# Altium footprint library Connectors THD.PcbLib: 631 footprints (part 32 of 46) (continued)
## PHOENIX_1881590 [mm] "PHOENIX MCV Serie, Pitch 2.5mm, 4A, 160V, 6 Positions Header" (continued)
3D body: height 10.1, standoff -3.5, extent -8.45,-3.9 8.45,4.2

## PHOENIX_1881613 [mm] "MICRO COMBICON PCB Header, 4 A 80 V, Pitch: 2.5 mm, 8 Positions"
height 10.1
pads (8):
  round 1.9 hole 1.2: 1(-8.75,0) 2(-6.25,0) 3(-3.75,0) 4(-1.25,0) 5(1.25,0) 6(3.75,0) 7(6.25,0) 8(8.75,0)
Top Overlay:
  lines w0.2: -10.95,3.7 10.95,3.7 ; -9.9,-2 9.9,-2 ; -9.9,2 -9.1,2 -9.1,2.5 ccw(c-9.3,2.5) -9.3,2.7 ; -9.1,2.134 -9.9,2.134 -9.9,-2.134 -8.65,-2.134 ; -8.65,-2 -8.65,-3.1 -7.5,-3.1 -7.5,-2 ; -8.4,2.134 -6.6,2.134 ; -8.2,2.7 ccw(c-8.2,2.5) -8.4,2.5 -8.4,2 -6.6,2 -6.6,2.5 ccw(c-6.8,2.5) -6.8,2.7 ; -7.5,-2.134 8.85,-2.134 ; -5.9,2.134 -4.1,2.134 ; -5.7,2.7 ccw(c-5.7,2.5) -5.9,2.5 -5.9,2 -4.1,2 -4.1,2.5 ccw(c-4.3,2.5) -4.3,2.7 ; -3.4,2.134 -1.6,2.134 ; -3.2,2.7 ccw(c-3.2,2.5) -3.4,2.5 -3.4,2 -1.6,2 -1.6,2.5 ccw(c-1.8,2.5) -1.8,2.7 ; -0.9,2.134 0.9,2.134 ; -0.7,2.7 ccw(c-0.7,2.5) -0.9,2.5 -0.9,2 0.9,2 0.9,2.5 ccw(c0.7,2.5) 0.7,2.7 ; 1.6,2.134 3.4,2.134 ; 1.8,2.7 ccw(c1.8,2.5) 1.6,2.5 1.6,2 3.4,2 3.4,2.5 ccw(c3.2,2.5) 3.2,2.7 ; 4.1,2.134 5.9,2.134 ; 4.3,2.7 ccw(c4.3,2.5) 4.1,2.5 4.1,2 5.9,2 5.9,2.5 ccw(c5.7,2.5) 5.7,2.7 ; 6.6,2.134 8.4,2.134 ; 6.8,2.7 ccw(c6.8,2.5) 6.6,2.5 6.6,2 8.4,2 8.4,2.5 ccw(c8.2,2.5) 8.2,2.7 ; 8.85,-2 8.85,-3.1 9.9,-3.1 9.9,2.134 9.1,2.134 ; 9.3,2.7 ccw(c9.3,2.5) 9.1,2.5 9.1,2 9.9,2 ; -10.95,-3.9 10.95,-3.9 10.95,4.2 -10.95,4.2 -10.95,-3.9 ; -9.75,2.7 -7.75,2.7 -7.75,3.35 -9.75,3.35 -9.75,2.7 ; -7.701,-0.75 -7.5,0 -7.299,-0.75 -7.701,-0.75 ; -7.25,2.7 -5.25,2.7 -5.25,3.35 -7.25,3.35 -7.25,2.7 ; -5.201,-0.75 -5,0 -4.799,-0.75 -5.201,-0.75 ; -4.75,2.7 -2.75,2.7 -2.75,3.35 -4.75,3.35 -4.75,2.7 ; -2.701,-0.75 -2.5,0 -2.299,-0.75 -2.701,-0.75 ; -2.25,2.7 -0.25,2.7 -0.25,3.35 -2.25,3.35 -2.25,2.7 ; -0.201,-0.75 0,0 0.201,-0.75 -0.201,-0.75 ; 0.25,2.7 2.25,2.7 2.25,3.35 0.25,3.35 0.25,2.7 ; 2.299,-0.75 2.5,0 2.701,-0.75 2.299,-0.75 ; 2.75,2.7 4.75,2.7 4.75,3.35 2.75,3.35 2.75,2.7 ; 4.799,-0.75 5,0 5.201,-0.75 4.799,-0.75 ; 5.25,2.7 7.25,2.7 7.25,3.35 5.25,3.35 5.25,2.7 ; 7.299,-0.75 7.5,0 7.701,-0.75 7.299,-0.75 ; 7.75,2.7 9.75,2.7 9.75,3.35 7.75,3.35 7.75,2.7
  text "7" at 5.975,4.6 h1
  text "5" at 0.975,4.6 h1
  text "3" at -4.025,4.6 h1
  text "2" at -6.525,4.6 h1
  text "1" at -9.025,4.6 h1
  text "4" at -1.525,4.6 h1
  text "6" at 3.475,4.6 h1
  text "8" at 8.475,4.6 h1
Mechanical 8:
  lines w0.1: -9.75,0 -8.75,0 ; -8.75,-1 -8.75,0 ; -8.75,1 -8.75,0 ; -7.75,0 -8.75,0 ; -7.25,0 -6.25,0 ; -6.25,-1 -6.25,0 ; -6.25,1 -6.25,0 ; -5.25,0 -6.25,0 ; -4.75,0 -3.75,0 ; -3.75,-1 -3.75,0 ; -3.75,1 -3.75,0 ; -2.75,0 -3.75,0 ; -2.25,0 -1.25,0 ; -1.25,-1 -1.25,0 ; -1.25,1 -1.25,0 ; -1,0 0,0 ; -0.25,0 -1.25,0 ; 0,-1 0,0 ; 0,1 0,0 ; 0.25,0 1.25,0 ; 1,0 0,0 ; 1.25,-1 1.25,0 ; 1.25,1 1.25,0 ; 2.25,0 1.25,0 ; 2.75,0 3.75,0 ; 3.75,-1 3.75,0 ; 3.75,1 3.75,0 ; 4.75,0 3.75,0 ; 5.25,0 6.25,0 ; 6.25,-1 6.25,0 ; 6.25,1 6.25,0 ; 7.25,0 6.25,0 ; 7.75,0 8.75,0 ; 8.75,-1 8.75,0 ; 8.75,1 8.75,0 ; 9.75,0 8.75,0
Mechanical 14:
  lines w0.1: -10.95,3.7 10.95,3.7 ; -9.9,-2 9.9,-2 ; -9.9,2 -9.1,2 -9.1,2.5 ccw(c-9.3,2.5) -9.3,2.7 ; -9.1,2.134 -9.9,2.134 -9.9,-2.134 -8.65,-2.134 ; -8.65,-2 -8.65,-3.1 -7.5,-3.1 -7.5,-2 ; -8.4,2.134 -6.6,2.134 ; -8.2,2.7 ccw(c-8.2,2.5) -8.4,2.5 -8.4,2 -6.6,2 -6.6,2.5 ccw(c-6.8,2.5) -6.8,2.7 ; -7.5,-2.134 8.85,-2.134 ; -5.9,2.134 -4.1,2.134 ; -5.7,2.7 ccw(c-5.7,2.5) -5.9,2.5 -5.9,2 -4.1,2 -4.1,2.5 ccw(c-4.3,2.5) -4.3,2.7 ; -3.4,2.134 -1.6,2.134 ; -3.2,2.7 ccw(c-3.2,2.5) -3.4,2.5 -3.4,2 -1.6,2 -1.6,2.5 ccw(c-1.8,2.5) -1.8,2.7 ; -0.9,2.134 0.9,2.134 ; -0.7,2.7 ccw(c-0.7,2.5) -0.9,2.5 -0.9,2 0.9,2 0.9,2.5 ccw(c0.7,2.5) 0.7,2.7 ; 1.6,2.134 3.4,2.134 ; 1.8,2.7 ccw(c1.8,2.5) 1.6,2.5 1.6,2 3.4,2 3.4,2.5 ccw(c3.2,2.5) 3.2,2.7 ; 4.1,2.134 5.9,2.134 ; 4.3,2.7 ccw(c4.3,2.5) 4.1,2.5 4.1,2 5.9,2 5.9,2.5 ccw(c5.7,2.5) 5.7,2.7 ; 6.6,2.134 8.4,2.134 ; 6.8,2.7 ccw(c6.8,2.5) 6.6,2.5 6.6,2 8.4,2 8.4,2.5 ccw(c8.2,2.5) 8.2,2.7 ; 8.85,-2 8.85,-3.1 9.9,-3.1 9.9,2.134 9.1,2.134 ; 9.3,2.7 ccw(c9.3,2.5) 9.1,2.5 9.1,2 9.9,2 ; -10.95,-3.9 10.95,-3.9 10.95,4.2 -10.95,4.2 -10.95,-3.9 ; -9.75,2.7 -7.75,2.7 -7.75,3.35 -9.75,3.35 -9.75,2.7 ; -7.701,-0.75 -7.5,0 -7.299,-0.75 -7.701,-0.75 ; -7.25,2.7 -5.25,2.7 -5.25,3.35 -7.25,3.35 -7.25,2.7 ; -5.201,-0.75 -5,0 -4.799,-0.75 -5.201,-0.75 ; -4.75,2.7 -2.75,2.7 -2.75,3.35 -4.75,3.35 -4.75,2.7 ; -2.701,-0.75 -2.5,0 -2.299,-0.75 -2.701,-0.75 ; -2.25,2.7 -0.25,2.7 -0.25,3.35 -2.25,3.35 -2.25,2.7 ; -0.201,-0.75 0,0 0.201,-0.75 -0.201,-0.75 ; 0.25,2.7 2.25,2.7 2.25,3.35 0.25,3.35 0.25,2.7 ; 2.299,-0.75 2.5,0 2.701,-0.75 2.299,-0.75 ; 2.75,2.7 4.75,2.7 4.75,3.35 2.75,3.35 2.75,2.7 ; 4.799,-0.75 5,0 5.201,-0.75 4.799,-0.75 ; 5.25,2.7 7.25,2.7 7.25,3.35 5.25,3.35 5.25,2.7 ; 7.299,-0.75 7.5,0 7.701,-0.75 7.299,-0.75 ; 7.75,2.7 9.75,2.7 9.75,3.35 7.75,3.35 7.75,2.7
3D body: height 10.1, standoff -3.5, extent -10.95,-3.9 10.95,4.2

## PHOENIX_1881655 [mm] "PCB Header, 4A, 160 V, Pitch: 2.5mm, 12 Positions, MCV Serie"
height 10.1
pads (12):
  round 1.9 hole 1.2: 1(-13.75,0) 2(-11.25,0) 3(-8.75,0) 4(-6.25,0) 5(-3.75,0) 6(-1.25,0) 7(1.25,0) 8(3.75,0) 9(6.25,0) 10(8.75,0) 11(11.25,0) 12(13.75,0)
Top Overlay:
  drawing of 186 lines, arcs and shapes, not listed
  text "1" at -13.61,4.7 h1
  text "12" at 13.06,4.7 h1
  text "11" at 10.56,4.7 h1
  text "10" at 8.06,4.7 h1
  text "9" at 5.91,4.725 h1
  text "8" at 3.41,4.725 h1
  text "7" at 0.91,4.725 h1
  text "6" at -1.59,4.725 h1
  text "5" at -4.09,4.725 h1
  text "4" at -6.59,4.725 h1
  text "3" at -9.09,4.725 h1
  text "2" at -11.59,4.725 h1
Mechanical 8:
  lines w0.1: -14.25,0 -13.75,0 ; -13.75,-0.5 -13.75,0 ; -13.75,0.5 -13.75,0 ; -13.25,0 -13.75,0 ; -11.75,0 -11.25,0 ; -11.25,-0.5 -11.25,0 ; -11.25,0.5 -11.25,0 ; -10.75,0 -11.25,0 ; -9.25,0 -8.75,0 ; -8.75,-0.5 -8.75,0 ; -8.75,0.5 -8.75,0 ; -8.25,0 -8.75,0 ; -6.75,0 -6.25,0 ; -6.25,-0.5 -6.25,0 ; -6.25,0.5 -6.25,0 ; -5.75,0 -6.25,0 ; -4.25,0 -3.75,0 ; -3.75,-0.5 -3.75,0 ; -3.75,0.5 -3.75,0 ; -3.25,0 -3.75,0 ; -1.75,0 -1.25,0 ; -1.25,-0.5 -1.25,0 ; -1.25,0.5 -1.25,0 ; -0.75,0 -1.25,0 ; -0.5,0 0,0 ; 0,-0.5 0,0 ; 0,0.5 0,0 ; 0.5,0 0,0 ; 0.75,0 1.25,0 ; 1.25,-0.5 1.25,0 ; 1.25,0.5 1.25,0 ; 1.75,0 1.25,0 ; 3.25,0 3.75,0 ; 3.75,-0.5 3.75,0 ; 3.75,0.5 3.75,0 ; 4.25,0 3.75,0 ; 5.75,0 6.25,0 ; 6.25,-0.5 6.25,0 ; 6.25,0.5 6.25,0 ; 6.75,0 6.25,0 ; 8.25,0 8.75,0 ; 8.75,-0.5 8.75,0 ; 8.75,0.5 8.75,0 ; 9.25,0 8.75,0 ; 10.75,0 11.25,0 ; 11.25,-0.5 11.25,0 ; 11.25,0.5 11.25,0 ; 11.75,0 11.25,0 ; 13.25,0 13.75,0 ; 13.75,-0.5 13.75,0 ; 13.75,0.5 13.75,0 ; 14.25,0 13.75,0
Mechanical 14:
  drawing of 280 lines, arcs and shapes, not listed
  text "12" at 13.06,4.7 h1
  text "1" at -13.61,4.7 h1
  text "11" at 10.56,4.7 h1
  text "10" at 8.06,4.7 h1
  text "9" at 5.91,4.725 h1
  text "8" at 3.41,4.725 h1
  text "7" at 0.91,4.725 h1
  text "6" at -1.59,4.725 h1
  text "5" at -4.09,4.725 h1
  text "4" at -6.59,4.725 h1
  text "3" at -9.09,4.725 h1
  text "2" at -11.59,4.725 h1
3D body: height 10.1, standoff -3.5, extent -15.95,-3.9 15.95,4.2

## PHOENIX_1911017 [mm] "8A, 160V, Pitch 3.5mm, 2 Positions Press-in Header"
height 9.2
pads (2):
  round 2 hole 1.3: 1(-1.75,0) 2(1.75,0)
Top Overlay:
  lines w0.2: -3.3,-2.3 -2.65,-2.3 ; -3.3,2 -2.15,2 -2.15,2.47 ccw(c-2.35,2.47) -2.35,2.67 ; -2.15,2.134 -3.3,2.134 -3.3,-2.434 -2.604,-2.434 ; -1.35,2.134 -0.2,2.134 -0.2,-2.434 -0.896,-2.434 ; -1.15,2.67 ccw(c-1.15,2.47) -1.35,2.47 -1.35,2 -0.2,2 ; -0.2,-2.3 -0.85,-2.3 ; 0.2,-2.3 0.85,-2.3 ; 0.2,2 1.35,2 1.35,2.47 ccw(c1.15,2.47) 1.15,2.67 ; 1.35,2.134 0.2,2.134 0.2,-2.434 0.896,-2.434 ; 2.15,2.134 3.3,2.134 3.3,-2.434 2.604,-2.434 ; 2.35,2.67 ccw(c2.35,2.47) 2.15,2.47 2.15,2 3.3,2 ; 3.3,-2.3 2.65,-2.3 ; -2.65,-2.3 cw(c-1.75,-3.5) -0.85,-2.3 ; -2.65,-2.3 -2.604,-2.434 ; -2.604,-2.434 cw(c-1.75,-3.5) -0.896,-2.434 ; -0.896,-2.434 -0.85,-2.3 ; 0.85,-2.3 cw(c1.75,-3.5) 2.65,-2.3 ; 0.85,-2.3 0.896,-2.434 ; 0.896,-2.434 cw(c1.75,-3.5) 2.604,-2.434 ; 2.604,-2.434 2.65,-2.3 ; -4.2,-3 4.2,-3 4.2,4.25 -4.2,4.25 -4.2,-3 ; -3.24,3.35 -0.26,3.35 -0.495,2.67 -3.005,2.67 -3.24,3.35 ; 0.26,3.35 3.24,3.35 3.005,2.67 0.495,2.67 0.26,3.35
  text "1" at -5.225,2.8 h1.2
Mechanical 8:
  lines w0.1: -2.25,0 -1.75,0 ; -1.75,-0.5 -1.75,0 ; -1.75,0.5 -1.75,0 ; -1.25,0 -1.75,0 ; -0.5,0 0,0 ; 0,-0.5 0,0 ; 0,0.5 0,0 ; 0.5,0 0,0 ; 1.25,0 1.75,0 ; 1.75,-0.5 1.75,0 ; 1.75,0.5 1.75,0 ; 2.25,0 1.75,0
Mechanical 14:
  circle w0.1: c1.75,0 r0.8
  lines w0.1: -3.3,-2.3 -2.65,-2.3 ; -3.3,2 -2.15,2 -2.15,2.47 ccw(c-2.35,2.47) -2.35,2.67 ; -2.15,2.134 -3.3,2.134 -3.3,-2.434 -2.604,-2.434 ; -1.618,-0.132 -1.35,-0.4 ; -1.35,2.134 -0.2,2.134 -0.2,-2.434 -0.896,-2.434 ; -1.15,2.67 ccw(c-1.15,2.47) -1.35,2.47 -1.35,2 -0.2,2 ; -0.2,-2.3 -0.85,-2.3 ; 0.2,-2.3 0.85,-2.3 ; 0.2,2 1.35,2 1.35,2.47 ccw(c1.15,2.47) 1.15,2.67 ; 1.35,2.134 0.2,2.134 0.2,-2.434 0.896,-2.434 ; 1.882,-0.132 2.15,-0.4 ; 2.15,2.134 3.3,2.134 3.3,-2.434 2.604,-2.434 ; 2.35,2.67 ccw(c2.35,2.47) 2.15,2.47 2.15,2 3.3,2 ; 3.3,-2.3 2.65,-2.3 ; -2.65,-2.3 cw(c-1.75,-3.5) -0.85,-2.3 ; -2.65,-2.3 -2.604,-2.434 ; -2.604,-2.434 cw(c-1.75,-3.5) -0.896,-2.434 ; -2.15,-0.4 -1.35,-0.4 ; -2.15,-0.4 -2.15,0.4 ; -2.15,-0.4 -1.89,-0.14 ; -2.15,0.4 -1.35,0.4 ; -2.15,0.4 -1.89,0.14 ; -1.89,-0.14 -1.89,0.14 ; -1.89,-0.14 -1.61,-0.14 -1.61,0.14 ; -1.89,0.14 -1.61,0.14 ; -1.61,0.14 -1.35,0.4 ; -1.35,-0.4 -1.35,0.4 ; -0.896,-2.434 -0.85,-2.3 ; 0.85,-2.3 cw(c1.75,-3.5) 2.65,-2.3 ; 0.85,-2.3 0.896,-2.434 ; 0.896,-2.434 cw(c1.75,-3.5) 2.604,-2.434 ; 1.35,-0.4 2.15,-0.4 ; 1.35,-0.4 1.35,0.4 ; 1.35,-0.4 1.61,-0.14 ; 1.35,0.4 2.15,0.4 ; 1.35,0.4 1.61,0.14 ; 1.61,-0.14 1.61,0.14 ; 1.61,-0.14 1.89,-0.14 1.89,0.14 ; 1.61,0.14 1.89,0.14 ; 1.89,0.14 2.15,0.4 ; 2.15,-0.4 2.15,0.4 ; 2.604,-2.434 2.65,-2.3 ; -4.2,-3 4.2,-3 4.2,4.25 -4.2,4.25 -4.2,-3 ; -3.24,3.35 -0.26,3.35 -0.495,2.67 -3.005,2.67 -3.24,3.35 ; -2.25,-0.625 ccw(c-1.75,0) -2.25,0.625 -2.25,-0.624 ; 0.26,3.35 3.24,3.35 3.005,2.67 0.495,2.67 0.26,3.35
  text "1" at -5.225,2.8 h1.2
Drill Drawing:
  lines w0.1: -4.2,-3 -4.2,4.25 4.2,4.25 4.2,-3 -4.2,-3
  text "+0.09 -0.06" at -3.65,1.725 h0.8
  text "PRESS-FIT" at -2.925,-2.575 h0.8
  text "diam. 1.3mm" at -3.7,3.025 h0.8
3D body: height 9.2, standoff -3.8, extent -4.2,-3 4.2,4.25

## PHOENIX_1985807 [mm] "Terminal Block, 10A 63V, Pitch 3.5mm, 2 Positions, Screw Connection, Black Color"
height 8.5
pads (2):
  round 1.8 hole 1.1: 1(-1.75,0) 2(1.75,0)
Top Overlay:
  circle w0.2: c1.75,-0.05 r1.45
  circle w0.2: c-1.75,-0.05 r1.45
  lines w0.2: -3.75,-2.049 3.75,-2.049 ; -3.75,-1.566 3.75,-1.566 ; -3.75,1.487 3.75,1.487 ; -3.75,1.962 3.75,1.962 ; -3.75,-3.6 -3.75,3.7 3.75,3.7 3.75,-3.6 -3.75,-3.6
  text "2" at 1.45,2.375 h1
  text "1" at -1.95,2.375 h1
Mechanical 8:
  lines w0.1: -2.75,0 -1.75,0 ; -1.75,-1 -1.75,0 ; -1.75,1 -1.75,0 ; -1,0 0,0 ; -0.75,0 -1.75,0 ; 0,-1 0,0 ; 0,1 0,0 ; 0.75,0 1.75,0 ; 1,0 0,0 ; 1.75,-1 1.75,0 ; 1.75,1 1.75,0 ; 2.75,0 1.75,0
Mechanical 14:
  circle w0.1: c1.75,-0.05 r1.4
  circle w0.1: c-1.75,-0.05 r1.4
  circle w0.1: c1.75,-0.05 r1.45
  circle w0.1: c-1.75,-0.05 r1.45
  lines w0.1: -3.75,-2.049 3.75,-2.049 ; -3.75,-1.566 3.75,-1.566 ; -3.75,1.487 3.75,1.487 ; -3.75,1.962 3.75,1.962 ; -2.956,-0.761 -1.039,1.156 ; -2.461,-1.256 -0.544,0.661 ; 0.544,-0.761 2.461,1.156 ; 1.039,-1.256 2.956,0.661 ; -3.75,-3.6 -3.75,3.7 3.75,3.7 3.75,-3.6 -3.75,-3.6
3D body: height 8.5, standoff -3.5, extent -3.75,-3.6 3.75,3.7

## PHOENIX_2908472 [mm] "24A 320V PCB Terminal Block, Pitch 5mm, 4 Positions, Screw Connection (Conductor/PCB connection direction: 0 °)"
height 16.45
pads (4):
  round 2.1 hole 1.4: 5(-7.5,0) 6(-2.5,0) 7(2.5,0) 8(7.5,0)
Top Overlay:
  lines w0.2: -9.1,2.5 -8,2.5 -8,4.1 7.9,4.1 7.9,1.342 ; -9.1,2.75 -8,2.75 ; -8,3.6 -9.1,3.6 ; -2.831,4.1 -2.831,3.3 7.1,3.3 7.1,1.342 ; 4.2,7 4.2,8.2 ; 4.9,7 3.334,7 3.334,8.2 4.9,8.2 ; 4.9,11 5.467,11 5.9,11.25 5.9,11.9 3.7,11.9 3.7,12.9 4.467,12.9 4.9,13.15 4.9,13.9 -4.75,13.9 ccw(c-4.75,13.4) -5.25,13.4 -5.25,13.2 -10.55,11.2 -11.85,11.2 ccw(c-11.85,10.9) -12.15,10.9 -12.15,5.9 ccw(c-11.85,5.9) -11.85,5.6 -8.65,5.6 -8.65,4.6 -9.33,4.6 -9.85,4.3 -9.85,3.6 -9.1,3.6 ; 4.9,11.9 4.9,5 8.3,5 9.1,4.2 9.1,-1.4 7.9,-1.4 7.9,-1.342 ; 7.1,-1.342 7.1,-1.4 -9.1,-1.4 -9.1,3.6
  text "7" at 2.25,-3.025 h1
  text "6" at -2.8,-3.025 h1
  text "5" at -7.825,-3.025 h1
  text "8" at 7.2,-2.972 h1
Mechanical 8:
  lines w0.1: -8,0 -7.5,0 ; -7.5,-0.5 -7.5,0 ; -7.5,0.5 -7.5,0 ; -7,0 -7.5,0 ; -3,0 -2.5,0 ; -2.5,-0.5 -2.5,0 ; -2.5,0.5 -2.5,0 ; -2,0 -2.5,0 ; -0.354,-0.354 0,0 ; -0.354,0.354 0,0 ; 0.354,-0.354 0,0 ; 0.354,0.354 0,0 ; 2,0 2.5,0 ; 2.5,-0.5 2.5,0 ; 2.5,0.5 2.5,0 ; 3,0 2.5,0 ; 7,0 7.5,0 ; 7.5,-0.5 7.5,0 ; 7.5,0.5 7.5,0 ; 8,0 7.5,0
Mechanical 14:
  lines w0.1: -9.1,2.5 -8,2.5 -8,4.1 7.9,4.1 7.9,-1.4 9.1,-1.4 9.1,4.2 8.3,5 4.9,5 4.9,11.9 ; -9.1,2.75 -8,2.75 ; -8,3.6 -9.1,3.6 ; -2.831,4.1 -2.831,3.3 7.1,3.3 7.1,-1.4 -9.1,-1.4 -9.1,3.6 ; 4.2,7 4.2,8.2 ; 4.9,7 3.334,7 3.334,8.2 4.9,8.2 ; 4.9,11 5.467,11 5.9,11.25 5.9,11.9 3.7,11.9 3.7,12.9 4.467,12.9 4.9,13.15 4.9,13.9 -4.75,13.9 ccw(c-4.75,13.4) -5.25,13.4 -5.25,13.2 -10.55,11.2 -11.85,11.2 ccw(c-11.85,10.9) -12.15,10.9 -12.15,5.9 ccw(c-11.85,5.9) -11.85,5.6 -8.65,5.6 -8.65,4.6 -9.33,4.6 -9.85,4.3 -9.85,3.6 -9.1,3.6 ; 7.1,-0.5 7.9,-0.5
  text "8" at 7.2,-2.972 h1
  text "5" at -7.825,-3.025 h1
  text "6" at -2.8,-3.025 h1
  text "7" at 2.25,-3.025 h1
3D body: height 16.45, standoff -4.5, extent -12.15,-1.4 9.1,13.9

## PHOENIX_2908485 [mm] "24A 320V Lateral Pin Exit Terminal Block, Pitch 5mm, 4 Positions, Screw Connection (Conductor/PCB connection direction: 0 °)"
height 16.45
pads (4):
  round 2.1 hole 1.4: 1(7.5,0) 2(2.5,0) 3(-2.5,0) 4(-7.5,0)
Top Overlay:
  lines w0.2: -7.9,-1.342 -7.9,-1.4 -9.1,-1.4 -9.1,4.2 -8.3,5 -4.9,5 ; -7.9,1.342 -7.9,4.1 8,4.1 8,2.5 9.1,2.5 ; -7.1,-1.342 -7.1,-1.4 9.1,-1.4 9.1,3.6 ; -7.1,1.342 -7.1,3.3 2.831,3.3 2.831,4.1 ; -4.9,7 -3.334,7 -3.334,8.2 -4.9,8.2 ; -4.9,11 -5.467,11 -5.9,11.25 -5.9,11.9 -3.7,11.9 -3.7,12.9 -4.9,12.9 -4.9,13.9 4.75,13.9 cw(c4.75,13.4) 5.25,13.4 5.25,13.2 10.55,11.2 11.85,11.2 cw(c11.85,10.9) 12.15,10.9 12.15,5.9 cw(c11.85,5.9) 11.85,5.6 8.65,5.6 8.65,4.6 9.33,4.6 9.85,4.3 9.85,3.6 8,3.6 ; -4.9,11.9 -4.9,4.4 -4.1,4.1 ; -4.2,7 -4.2,8.2 ; 8,2.75 9.1,2.75
  text "1" at 7.2,-2.972 h1
  text "4" at -7.825,-3.025 h1
  text "3" at -2.8,-3.025 h1
  text "2" at 2.25,-3.025 h1
Mechanical 8:
  lines w0.1: -8,0 -7.5,0 ; -7.5,-0.5 -7.5,0 ; -7.5,0.5 -7.5,0 ; -7,0 -7.5,0 ; -3,0 -2.5,0 ; -2.5,-0.5 -2.5,0 ; -2.5,0.5 -2.5,0 ; -2,0 -2.5,0 ; -0.354,-0.354 0,0 ; -0.354,0.354 0,0 ; 0.354,-0.354 0,0 ; 0.354,0.354 0,0 ; 2,0 2.5,0 ; 2.5,-0.5 2.5,0 ; 2.5,0.5 2.5,0 ; 3,0 2.5,0 ; 7,0 7.5,0 ; 7.5,-0.5 7.5,0 ; 7.5,0.5 7.5,0 ; 8,0 7.5,0
Mechanical 14:
  lines w0.1: -4.9,5 -8.3,5 -9.1,4.2 -9.1,-1.4 -7.9,-1.4 -7.9,4.1 8,4.1 8,2.5 9.1,2.5 ; -4.9,7 -3.334,7 -3.334,8.2 -4.9,8.2 ; -4.9,11 -5.467,11 -5.9,11.25 -5.9,11.9 -3.7,11.9 -3.7,12.9 -4.9,12.9 -4.9,13.9 4.75,13.9 cw(c4.75,13.4) 5.25,13.4 5.25,13.2 10.55,11.2 11.85,11.2 cw(c11.85,10.9) 12.15,10.9 12.15,5.9 cw(c11.85,5.9) 11.85,5.6 8.65,5.6 8.65,4.6 9.33,4.6 9.85,4.3 9.85,3.6 8,3.6 ; -4.9,11.9 -4.9,4.4 -4.1,4.1 ; -4.2,7 -4.2,8.2 ; 2.831,4.1 2.831,3.3 -7.1,3.3 -7.1,-1.4 9.1,-1.4 9.1,3.6 ; 8,2.75 9.1,2.75
  text "2" at 2.25,-3.025 h1
  text "3" at -2.8,-3.025 h1
  text "4" at -7.825,-3.025 h1
  text "1" at 7.2,-2.972 h1
3D body: height 16.45, standoff -4.5, extent -9.1,-1.4 12.15,13.9

## PLD-1315TM [mm] "Fiber Optic Transmitter, Through Hole Mount"
height 10.2
pads (8):
  round 1.7 hole 1: 1(-1.27,3.81) 4(-1.27,-3.81) 5(1.27,-3.81) 8(1.27,3.81)
  round 1.4 hole 0.7: 2(-1.27,1.27) 3(-1.27,-1.27) 6(1.27,-1.27) 7(1.27,1.27)
Top Overlay:
  circle w0.3: c-3.81,5.08 r0.15
  lines w0.2: 7.62,-4.25 8.12,-4.75 ; 7.62,4.25 8.12,4.75 ; 12.62,-3.525 24.72,-3.525 ; 12.62,3.525 24.72,3.525 ; 19.52,-3.525 19.52,-4.1 20.92,-4.1 20.92,-3.525 ; 19.52,3.525 19.52,4.1 20.92,4.1 20.92,3.525 ; 24.72,-0.6 18.52,-0.6 cw(c18.52,0) 18.52,0.6 24.72,0.6 ; 8.12,-4.75 8.12,4.75 ; 8.12,-4.75 8.62,-4.25 ; 8.12,4.75 8.62,4.25 ; 8.62,-4.25 8.62,4.25 ; 8.62,-4.25 9.12,-4.75 ; 8.62,4.25 9.12,4.75 ; 9.12,-4.75 9.12,4.75 ; 9.12,-4.75 9.62,-4.25 ; 9.12,4.75 9.62,4.25 ; 9.62,-4.25 9.62,4.25 ; 9.62,-4.25 10.12,-4.75 ; 9.62,4.25 10.12,4.75 ; 10.12,-4.75 10.12,4.75 ; 10.12,-4.75 10.62,-4.25 ; 10.12,4.75 10.62,4.25 ; 10.62,-4.25 10.62,4.25 ; 10.62,-4.25 11.12,-4.75 ; 10.62,4.25 11.12,4.75 ; 11.12,-4.75 11.12,4.75 ; 11.12,-4.75 11.62,-4.25 ; 11.12,4.75 11.62,4.25 ; 11.62,-4.25 11.62,4.25 ; 11.62,-4.25 12.12,-4.75 ; 11.62,4.25 12.12,4.75 ; 12.12,-4.75 12.12,4.75 ; 12.12,-4.75 12.62,-4.25 12.62,4.25 12.12,4.75 ; 24.72,-3.525 24.72,3.525 ; 24.72,-3.525 24.72,3.525 ; -5.08,-6.35 7.62,-6.35 7.62,6.35 -5.08,6.35 -5.08,-6.35
Mechanical 8:
  lines w0.1: -2.27,-3.81 -1.27,-3.81 ; -2.27,-1.27 -1.27,-1.27 ; -2.27,1.27 -1.27,1.27 ; -2.27,3.81 -1.27,3.81 ; -1.27,-4.81 -1.27,-3.81 ; -1.27,-2.81 -1.27,-3.81 ; -1.27,-2.27 -1.27,-1.27 ; -1.27,-0.27 -1.27,-1.27 ; -1.27,0.27 -1.27,1.27 ; -1.27,2.27 -1.27,1.27 ; -1.27,2.81 -1.27,3.81 ; -1.27,4.81 -1.27,3.81 ; -1,0 0,0 ; -0.27,-3.81 -1.27,-3.81 ; -0.27,-1.27 -1.27,-1.27 ; -0.27,1.27 -1.27,1.27 ; -0.27,3.81 -1.27,3.81 ; 0,-1 0,0 ; 0,1 0,0 ; 0.27,-3.81 1.27,-3.81 ; 0.27,-1.27 1.27,-1.27 ; 0.27,1.27 1.27,1.27 ; 0.27,3.81 1.27,3.81 ; 1,0 0,0 ; 1.27,-4.81 1.27,-3.81 ; 1.27,-2.81 1.27,-3.81 ; 1.27,-2.27 1.27,-1.27 ; 1.27,-0.27 1.27,-1.27 ; 1.27,0.27 1.27,1.27 ; 1.27,2.27 1.27,1.27 ; 1.27,2.81 1.27,3.81 ; 1.27,4.81 1.27,3.81 ; 2.27,-3.81 1.27,-3.81 ; 2.27,-1.27 1.27,-1.27 ; 2.27,1.27 1.27,1.27 ; 2.27,3.81 1.27,3.81
Mechanical 14:
  circle w0.3: c-3.81,5.08 r0.15
  lines w0.1: 7.62,-4.25 8.12,-4.75 ; 7.62,4.25 8.12,4.75 ; 12.62,-3.525 24.72,-3.525 24.72,3.525 12.62,3.525 ; 19.52,-3.525 19.52,-4.1 20.92,-4.1 20.92,-3.525 ; 19.52,3.525 19.52,4.1 20.92,4.1 20.92,3.525 ; 24.72,-0.6 18.52,-0.6 cw(c18.52,0) 18.52,0.6 24.72,0.6 ; 8.12,-4.75 8.12,4.75 ; 8.12,-4.75 8.62,-4.25 ; 8.12,4.75 8.62,4.25 ; 8.62,-4.25 8.62,4.25 ; 8.62,-4.25 9.12,-4.75 ; 8.62,4.25 9.12,4.75 ; 9.12,-4.75 9.12,4.75 ; 9.12,-4.75 9.62,-4.25 ; 9.12,4.75 9.62,4.25 ; 9.62,-4.25 9.62,4.25 ; 9.62,-4.25 10.12,-4.75 ; 9.62,4.25 10.12,4.75 ; 10.12,-4.75 10.12,4.75 ; 10.12,-4.75 10.62,-4.25 ; 10.12,4.75 10.62,4.25 ; 10.62,-4.25 10.62,4.25 ; 10.62,-4.25 11.12,-4.75 ; 10.62,4.25 11.12,4.75 ; 11.12,-4.75 11.12,4.75 ; 11.12,-4.75 11.62,-4.25 ; 11.12,4.75 11.62,4.25 ; 11.62,-4.25 11.62,4.25 ; 11.62,-4.25 12.12,-4.75 ; 11.62,4.25 12.12,4.75 ; 12.12,-4.75 12.12,4.75 ; 12.12,-4.75 12.62,-4.25 12.62,4.25 12.12,4.75 ; -5.08,-6.15 ccw(c-4.88,-6.15) -4.88,-6.35 7.42,-6.35 ccw(c7.42,-6.15) 7.62,-6.15 7.62,6.15 ccw(c7.42,6.15) 7.42,6.35 -4.88,6.35 ccw(c-4.88,6.15) -5.08,6.15 -5.08,-6.15
3D body: height 10.2, standoff -3.6, extent -5.08,-6.35 24.72,6.35

## PLD-2315TM [mm] "Fiber Optic Receiver, Through Hole Mount"
height 10.2
pads (8):
  round 1.7 hole 1: 1(-1.27,3.81) 4(-1.27,-3.81) 5(1.27,-3.81) 8(1.27,3.81)
  round 1.4 hole 0.7: 2(-1.27,1.27) 3(-1.27,-1.27) 6(1.27,-1.27) 7(1.27,1.27)
Top Overlay:
  circle w0.3: c-3.81,5.08 r0.15
  lines w0.2: 7.62,-4.25 8.12,-4.75 ; 7.62,4.25 8.12,4.75 ; 12.62,-3.525 24.72,-3.525 ; 12.62,3.525 24.72,3.525 ; 19.52,-3.525 19.52,-4.1 20.92,-4.1 20.92,-3.525 ; 19.52,3.525 19.52,4.1 20.92,4.1 20.92,3.525 ; 24.72,-0.6 18.52,-0.6 cw(c18.52,0) 18.52,0.6 24.72,0.6 ; 8.12,-4.75 8.12,4.75 ; 8.12,-4.75 8.62,-4.25 ; 8.12,4.75 8.62,4.25 ; 8.62,-4.25 8.62,4.25 ; 8.62,-4.25 9.12,-4.75 ; 8.62,4.25 9.12,4.75 ; 9.12,-4.75 9.12,4.75 ; 9.12,-4.75 9.62,-4.25 ; 9.12,4.75 9.62,4.25 ; 9.62,-4.25 9.62,4.25 ; 9.62,-4.25 10.12,-4.75 ; 9.62,4.25 10.12,4.75 ; 10.12,-4.75 10.12,4.75 ; 10.12,-4.75 10.62,-4.25 ; 10.12,4.75 10.62,4.25 ; 10.62,-4.25 10.62,4.25 ; 10.62,-4.25 11.12,-4.75 ; 10.62,4.25 11.12,4.75 ; 11.12,-4.75 11.12,4.75 ; 11.12,-4.75 11.62,-4.25 ; 11.12,4.75 11.62,4.25 ; 11.62,-4.25 11.62,4.25 ; 11.62,-4.25 12.12,-4.75 ; 11.62,4.25 12.12,4.75 ; 12.12,-4.75 12.12,4.75 ; 12.12,-4.75 12.62,-4.25 12.62,4.25 12.12,4.75 ; 24.72,-3.525 24.72,3.525 ; 24.72,-3.525 24.72,3.525 ; -5.08,-6.35 7.62,-6.35 7.62,6.35 -5.08,6.35 -5.08,-6.35
Mechanical 8:
  lines w0.1: -2.27,-3.81 -1.27,-3.81 ; -2.27,-1.27 -1.27,-1.27 ; -2.27,1.27 -1.27,1.27 ; -2.27,3.81 -1.27,3.81 ; -1.27,-4.81 -1.27,-3.81 ; -1.27,-2.81 -1.27,-3.81 ; -1.27,-2.27 -1.27,-1.27 ; -1.27,-0.27 -1.27,-1.27 ; -1.27,0.27 -1.27,1.27 ; -1.27,2.27 -1.27,1.27 ; -1.27,2.81 -1.27,3.81 ; -1.27,4.81 -1.27,3.81 ; -1,0 0,0 ; -0.27,-3.81 -1.27,-3.81 ; -0.27,-1.27 -1.27,-1.27 ; -0.27,1.27 -1.27,1.27 ; -0.27,3.81 -1.27,3.81 ; 0,-1 0,0 ; 0,1 0,0 ; 0.27,-3.81 1.27,-3.81 ; 0.27,-1.27 1.27,-1.27 ; 0.27,1.27 1.27,1.27 ; 0.27,3.81 1.27,3.81 ; 1,0 0,0 ; 1.27,-4.81 1.27,-3.81 ; 1.27,-2.81 1.27,-3.81 ; 1.27,-2.27 1.27,-1.27 ; 1.27,-0.27 1.27,-1.27 ; 1.27,0.27 1.27,1.27 ; 1.27,2.27 1.27,1.27 ; 1.27,2.81 1.27,3.81 ; 1.27,4.81 1.27,3.81 ; 2.27,-3.81 1.27,-3.81 ; 2.27,-1.27 1.27,-1.27 ; 2.27,1.27 1.27,1.27 ; 2.27,3.81 1.27,3.81
Mechanical 14:
  circle w0.3: c-3.81,5.08 r0.15
  lines w0.1: 7.62,-4.25 8.12,-4.75 ; 7.62,4.25 8.12,4.75 ; 12.62,-3.525 24.72,-3.525 24.72,3.525 12.62,3.525 ; 19.52,-3.525 19.52,-4.1 20.92,-4.1 20.92,-3.525 ; 19.52,3.525 19.52,4.1 20.92,4.1 20.92,3.525 ; 24.72,-0.6 18.52,-0.6 cw(c18.52,0) 18.52,0.6 24.72,0.6 ; 8.12,-4.75 8.12,4.75 ; 8.12,-4.75 8.62,-4.25 ; 8.12,4.75 8.62,4.25 ; 8.62,-4.25 8.62,4.25 ; 8.62,-4.25 9.12,-4.75 ; 8.62,4.25 9.12,4.75 ; 9.12,-4.75 9.12,4.75 ; 9.12,-4.75 9.62,-4.25 ; 9.12,4.75 9.62,4.25 ; 9.62,-4.25 9.62,4.25 ; 9.62,-4.25 10.12,-4.75 ; 9.62,4.25 10.12,4.75 ; 10.12,-4.75 10.12,4.75 ; 10.12,-4.75 10.62,-4.25 ; 10.12,4.75 10.62,4.25 ; 10.62,-4.25 10.62,4.25 ; 10.62,-4.25 11.12,-4.75 ; 10.62,4.25 11.12,4.75 ; 11.12,-4.75 11.12,4.75 ; 11.12,-4.75 11.62,-4.25 ; 11.12,4.75 11.62,4.25 ; 11.62,-4.25 11.62,4.25 ; 11.62,-4.25 12.12,-4.75 ; 11.62,4.25 12.12,4.75 ; 12.12,-4.75 12.12,4.75 ; 12.12,-4.75 12.62,-4.25 12.62,4.25 12.12,4.75 ; -5.08,-6.15 ccw(c-4.88,-6.15) -4.88,-6.35 7.42,-6.35 ccw(c7.42,-6.15) 7.62,-6.15 7.62,6.15 ccw(c7.42,6.15) 7.42,6.35 -4.88,6.35 ccw(c-4.88,6.15) -5.08,6.15 -5.08,-6.15
3D body: height 10.2, standoff -3.6, extent -5.08,-6.35 24.72,6.35